# Altium footprint library Vowstar_IC_General.PcbLib: 139 footprints (part 8 of 9)
Each footprint in its own frame and in the unit in brackets; x right, y up, seen from the top. Pads: shape width x height; smd on the part's side, far side on the other; paste and mask are expansions set on the pad; w line width, h text height; cw(c..) or ccw(c..) is an arc to the next point about the centre after c.
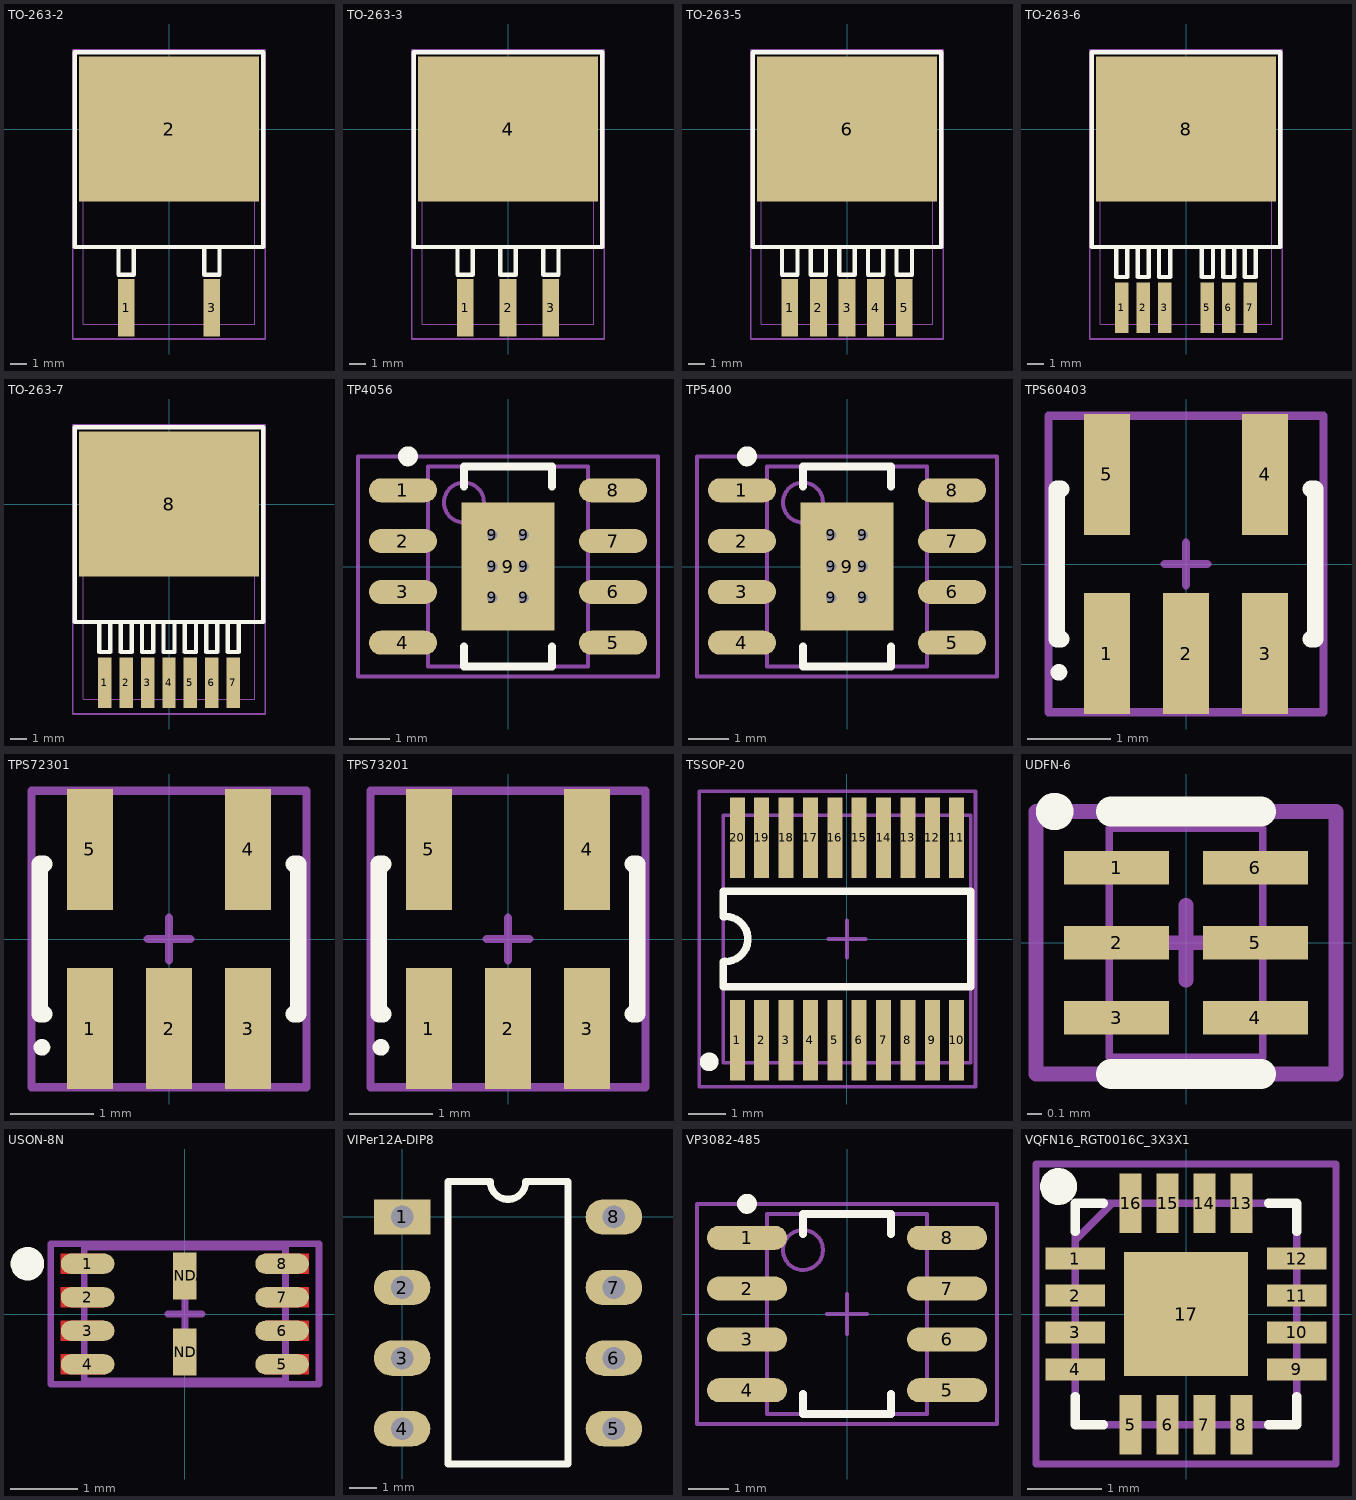
[diagram p7: the footprints below, top view; thin cyan lines are the x and y axes]

## TO-263-2 [mm] "TO-263-2,KTT2, The D2PAK or DDPAK, standardized as TO-263"
height 4.77
pads (3):
  rect 1x3.4 smd paste-0.05: 1(-2.54,-10.6) 3(2.54,-10.6)
  rect 10.7x8.6 smd paste-100: 2(0,0)
Top Overlay:
  lines w0.254: -2.997,-7.032 -2.997,-8.636 -2.083,-8.636 -2.083,-7.032 ; 2.083,-7.032 2.083,-8.636 2.997,-8.636 2.997,-7.032 ; -5.588,-6.985 5.588,-6.985 5.588,4.572 -5.588,4.572 -5.588,-6.985
Top Paste:
  rectangle: 1.524,-2.413 3.818,0
  rectangle: -1.143,-2.413 1.151,0
  rectangle: -3.81,-2.413 -1.516,0
  rectangle: -1.143,0.381 1.151,2.794
  rectangle: -5.207,-3.764 -4.257,-2.794
  rectangle: -3.855,-3.764 -2.905,-2.794
  rectangle: -2.503,-3.764 -1.553,-2.794
  rectangle: -1.151,-3.764 -0.201,-2.794
  rectangle: 0.201,-3.764 1.151,-2.794
  rectangle: 1.553,-3.764 2.503,-2.794
  rectangle: 2.905,-3.764 3.855,-2.794
  rectangle: 4.257,-3.764 5.207,-2.794
  rectangle: -5.207,-2.367 -4.257,-1.397
  rectangle: 4.257,-2.367 5.207,-1.397
  rectangle: -5.207,-0.97 -4.257,0
  rectangle: 4.257,-0.97 5.207,0
  rectangle: -5.207,0.427 -4.257,1.397
  rectangle: 4.257,0.427 5.207,1.397
  rectangle: -5.207,1.824 -4.257,2.794
  rectangle: 4.257,1.824 5.207,2.794
  rectangle: 4.257,3.221 5.207,4.191
  rectangle: 2.905,3.221 3.855,4.191
  rectangle: 1.553,3.221 2.503,4.191
  rectangle: 0.201,3.221 1.151,4.191
  rectangle: -1.151,3.221 -0.201,4.191
  rectangle: -2.503,3.221 -1.553,4.191
  rectangle: -3.855,3.221 -2.905,4.191
  rectangle: -5.207,3.221 -4.257,4.191
  rectangle: -3.81,0.381 -1.516,2.794
  rectangle: 1.524,0.381 3.818,2.794
Mechanical 13:
  lines w0.051: -5.08,-11.557 -5.08,3.683 5.08,3.683 5.08,-11.557 -5.08,-11.557
Mechanical 15:
  lines w0.1: -0.5,0 0.5,0 ; 0,-0.5 0,0.5 ; -5.715,-12.446 -5.715,4.699 5.715,4.699 5.715,-12.446 -5.715,-12.446
3D body "User Library-TO263-2.step": height 4.88, standoff -0.13, extent -5.08,-11.557 5.08,3.707

## TO-263-3 [mm] "TO-263-3,KTT3, The D2PAK or DDPAK, standardized as TO-263"
height 4.77
pads (4):
  rect 1x3.4 smd paste-0.05: 1(-2.54,-10.6) 2(0,-10.6) 3(2.54,-10.6)
  rect 10.7x8.6 smd paste-100: 4(0,0)
Top Overlay:
  lines w0.254: -2.997,-7.032 -2.997,-8.636 -2.083,-8.636 -2.083,-7.032 ; -0.457,-7.032 -0.457,-8.636 0.457,-8.636 0.457,-7.032 ; 2.083,-7.032 2.083,-8.636 2.997,-8.636 2.997,-7.032 ; -5.588,-6.985 -5.588,4.572 5.588,4.572 5.588,-6.985 -5.588,-6.985
Top Paste:
  rectangle: 1.524,-2.413 3.818,0
  rectangle: -1.143,-2.413 1.151,0
  rectangle: -3.81,-2.413 -1.516,0
  rectangle: -1.143,0.381 1.151,2.794
  rectangle: -5.207,-3.764 -4.257,-2.794
  rectangle: -3.855,-3.764 -2.905,-2.794
  rectangle: -2.503,-3.764 -1.553,-2.794
  rectangle: -1.151,-3.764 -0.201,-2.794
  rectangle: 0.201,-3.764 1.151,-2.794
  rectangle: 1.553,-3.764 2.503,-2.794
  rectangle: 2.905,-3.764 3.855,-2.794
  rectangle: 4.257,-3.764 5.207,-2.794
  rectangle: -5.207,-2.367 -4.257,-1.397
  rectangle: 4.257,-2.367 5.207,-1.397
  rectangle: -5.207,-0.97 -4.257,0
  rectangle: 4.257,-0.97 5.207,0
  rectangle: -5.207,0.427 -4.257,1.397
  rectangle: 4.257,0.427 5.207,1.397
  rectangle: -5.207,1.824 -4.257,2.794
  rectangle: 4.257,1.824 5.207,2.794
  rectangle: 4.257,3.221 5.207,4.191
  rectangle: 2.905,3.221 3.855,4.191
  rectangle: 1.553,3.221 2.503,4.191
  rectangle: 0.201,3.221 1.151,4.191
  rectangle: -1.151,3.221 -0.201,4.191
  rectangle: -2.503,3.221 -1.553,4.191
  rectangle: -3.855,3.221 -2.905,4.191
  rectangle: -5.207,3.221 -4.257,4.191
  rectangle: -3.81,0.381 -1.516,2.794
  rectangle: 1.524,0.381 3.818,2.794
Mechanical 13:
  lines w0.051: -5.08,-11.557 5.08,-11.557 5.08,3.683 -5.08,3.683 -5.08,-11.557
Mechanical 15:
  lines w0.1: -0.5,0 0.5,0 ; 0,-0.5 0,0.5 ; -5.715,-12.446 5.715,-12.446 5.715,4.699 -5.715,4.699 -5.715,-12.446
3D body "User Library-TO263-3.step": height 4.87, standoff 0, extent -5.08,-11.557 5.08,2.673

## TO-263-5 [mm] "TO-263-5,KTT5, The D2PAK or DDPAK, standardized as TO-263"
height 4.77
pads (6):
  rect 1x3.4 smd paste-0.05: 1(-3.4,-10.6) 2(-1.7,-10.6) 3(0,-10.6) 4(1.7,-10.6) 5(3.4,-10.6)
  rect 10.7x8.6 smd paste-100: 6(0,0)
Top Overlay:
  lines w0.254: -3.857,-7.032 -3.857,-8.636 -2.943,-8.636 -2.943,-7.032 ; -2.157,-7.032 -2.157,-8.636 -1.243,-8.636 -1.243,-7.032 ; -0.457,-7.032 -0.457,-8.636 0.457,-8.636 0.457,-7.032 ; 1.243,-7.032 1.243,-8.636 2.157,-8.636 2.157,-7.032 ; 2.943,-7.032 2.943,-8.636 3.857,-8.636 3.857,-7.032 ; -5.588,-6.985 5.588,-6.985 5.588,4.572 -5.588,4.572 -5.588,-6.985
Top Paste:
  rectangle: 1.524,0.381 3.818,2.794
  rectangle: -3.81,0.381 -1.516,2.794
  rectangle: -5.207,3.221 -4.257,4.191
  rectangle: -3.855,3.221 -2.905,4.191
  rectangle: -2.503,3.221 -1.553,4.191
  rectangle: -1.151,3.221 -0.201,4.191
  rectangle: 0.201,3.221 1.151,4.191
  rectangle: 1.553,3.221 2.503,4.191
  rectangle: 2.905,3.221 3.855,4.191
  rectangle: 4.257,3.221 5.207,4.191
  rectangle: 4.257,1.824 5.207,2.794
  rectangle: -5.207,1.824 -4.257,2.794
  rectangle: 4.257,0.427 5.207,1.397
  rectangle: -5.207,0.427 -4.257,1.397
  rectangle: 4.257,-0.97 5.207,0
  rectangle: -5.207,-0.97 -4.257,0
  rectangle: 4.257,-2.367 5.207,-1.397
  rectangle: -5.207,-2.367 -4.257,-1.397
  rectangle: 4.257,-3.764 5.207,-2.794
  rectangle: 2.905,-3.764 3.855,-2.794
  rectangle: 1.553,-3.764 2.503,-2.794
  rectangle: 0.201,-3.764 1.151,-2.794
  rectangle: -1.151,-3.764 -0.201,-2.794
  rectangle: -2.503,-3.764 -1.553,-2.794
  rectangle: -3.855,-3.764 -2.905,-2.794
  rectangle: -5.207,-3.764 -4.257,-2.794
  rectangle: -1.143,0.381 1.151,2.794
  rectangle: -3.81,-2.413 -1.516,0
  rectangle: -1.143,-2.413 1.151,0
  rectangle: 1.524,-2.413 3.818,0
Mechanical 13:
  lines w0.051: -5.08,-11.557 -5.08,3.683 5.08,3.683 5.08,-11.557 -5.08,-11.557
Mechanical 15:
  lines w0.1: -0.5,0 0.5,0 ; 0,-0.5 0,0.5 ; -5.715,-12.446 -5.715,4.699 5.715,4.699 5.715,-12.446 -5.715,-12.446
3D body "User Library-TO263-5.step": height 4.87, standoff 0, extent -5.08,-11.561 5.08,2.669

## TO-263-6 [mm] "TO-263-6,KTT6, The D2PAK or DDPAK, standardized as TO-263"
height 4.77
pads (7):
  rect 0.8x3 smd paste-0.05: 1(-3.81,-10.6) 2(-2.54,-10.6) 3(-1.27,-10.6) 5(1.27,-10.6) 6(2.54,-10.6) 7(3.81,-10.6)
  rect 10.7x8.6 smd paste-100: 8(0,0)
Top Overlay:
  lines w0.254: -4.14,-7.032 -4.14,-8.763 -3.48,-8.763 -3.48,-7.032 ; -2.87,-7.032 -2.87,-8.763 -2.21,-8.763 -2.21,-7.032 ; -1.6,-7.032 -1.6,-8.763 -0.94,-8.763 -0.94,-7.032 ; 0.94,-7.032 0.94,-8.763 1.6,-8.763 1.6,-7.032 ; 2.21,-7.032 2.21,-8.763 2.87,-8.763 2.87,-7.032 ; 3.48,-7.032 3.48,-8.763 4.14,-8.763 4.14,-7.032 ; -5.588,-6.985 -5.588,4.572 5.588,4.572 5.588,-6.985 -5.588,-6.985
Top Paste:
  rectangle: 1.524,0.381 3.818,2.794
  rectangle: -3.81,0.381 -1.516,2.794
  rectangle: -5.207,3.221 -4.257,4.191
  rectangle: -3.855,3.221 -2.905,4.191
  rectangle: -2.503,3.221 -1.553,4.191
  rectangle: -1.151,3.221 -0.201,4.191
  rectangle: 0.201,3.221 1.151,4.191
  rectangle: 1.553,3.221 2.503,4.191
  rectangle: 2.905,3.221 3.855,4.191
  rectangle: 4.257,3.221 5.207,4.191
  rectangle: 4.257,1.824 5.207,2.794
  rectangle: -5.207,1.824 -4.257,2.794
  rectangle: 4.257,0.427 5.207,1.397
  rectangle: -5.207,0.427 -4.257,1.397
  rectangle: 4.257,-0.97 5.207,0
  rectangle: -5.207,-0.97 -4.257,0
  rectangle: 4.257,-2.367 5.207,-1.397
  rectangle: -5.207,-2.367 -4.257,-1.397
  rectangle: 4.257,-3.764 5.207,-2.794
  rectangle: 2.905,-3.764 3.855,-2.794
  rectangle: 1.553,-3.764 2.503,-2.794
  rectangle: 0.201,-3.764 1.151,-2.794
  rectangle: -1.151,-3.764 -0.201,-2.794
  rectangle: -2.503,-3.764 -1.553,-2.794
  rectangle: -3.855,-3.764 -2.905,-2.794
  rectangle: -5.207,-3.764 -4.257,-2.794
  rectangle: -1.143,0.381 1.151,2.794
  rectangle: -3.81,-2.413 -1.516,0
  rectangle: -1.143,-2.413 1.151,0
  rectangle: 1.524,-2.413 3.818,0
Mechanical 13:
  lines w0.051: -5.08,-11.557 5.08,-11.557 5.08,3.683 -5.08,3.683 -5.08,-11.557
Mechanical 15:
  lines w0.1: -0.5,0 0.5,0 ; 0,-0.5 0,0.5 ; -5.715,-12.446 5.715,-12.446 5.715,4.699 -5.715,4.699 -5.715,-12.446
3D body "User Library-TO263-7.step": height 4.88, standoff 0.08, extent -5,-11.557 5,4.113

## TO-263-7 [mm] "TO-263-6,KTT7, The D2PAK or DDPAK, standardized as TO-263"
height 4.77
pads (8):
  rect 0.8x3 smd paste-0.05: 1(-3.81,-10.6) 2(-2.54,-10.6) 3(-1.27,-10.6) 4(0,-10.6) 5(1.27,-10.6) 6(2.54,-10.6) 7(3.81,-10.6)
  rect 10.7x8.6 smd paste-100: 8(0,0)
Top Overlay:
  lines w0.254: -4.14,-7.032 -4.14,-8.763 -3.48,-8.763 -3.48,-7.032 ; -2.87,-7.032 -2.87,-8.763 -2.21,-8.763 -2.21,-7.032 ; -1.6,-7.032 -1.6,-8.763 -0.94,-8.763 -0.94,-7.032 ; -0.33,-7.032 -0.33,-8.763 0.33,-8.763 0.33,-7.032 ; 0.94,-7.032 0.94,-8.763 1.6,-8.763 1.6,-7.032 ; 2.21,-7.032 2.21,-8.763 2.87,-8.763 2.87,-7.032 ; 3.48,-7.032 3.48,-8.763 4.14,-8.763 4.14,-7.032 ; -5.588,-6.985 5.588,-6.985 5.588,4.572 -5.588,4.572 -5.588,-6.985
Top Paste:
  rectangle: 1.524,-2.413 3.818,0
  rectangle: -1.143,-2.413 1.151,0
  rectangle: -3.81,-2.413 -1.516,0
  rectangle: -1.143,0.381 1.151,2.794
  rectangle: -5.207,-3.764 -4.257,-2.794
  rectangle: -3.855,-3.764 -2.905,-2.794
  rectangle: -2.503,-3.764 -1.553,-2.794
  rectangle: -1.151,-3.764 -0.201,-2.794
  rectangle: 0.201,-3.764 1.151,-2.794
  rectangle: 1.553,-3.764 2.503,-2.794
  rectangle: 2.905,-3.764 3.855,-2.794
  rectangle: 4.257,-3.764 5.207,-2.794
  rectangle: -5.207,-2.367 -4.257,-1.397
  rectangle: 4.257,-2.367 5.207,-1.397
  rectangle: -5.207,-0.97 -4.257,0
  rectangle: 4.257,-0.97 5.207,0
  rectangle: -5.207,0.427 -4.257,1.397
  rectangle: 4.257,0.427 5.207,1.397
  rectangle: -5.207,1.824 -4.257,2.794
  rectangle: 4.257,1.824 5.207,2.794
  rectangle: 4.257,3.221 5.207,4.191
  rectangle: 2.905,3.221 3.855,4.191
  rectangle: 1.553,3.221 2.503,4.191
  rectangle: 0.201,3.221 1.151,4.191
  rectangle: -1.151,3.221 -0.201,4.191
  rectangle: -2.503,3.221 -1.553,4.191
  rectangle: -3.855,3.221 -2.905,4.191
  rectangle: -5.207,3.221 -4.257,4.191
  rectangle: -3.81,0.381 -1.516,2.794
  rectangle: 1.524,0.381 3.818,2.794
Mechanical 13:
  lines w0.051: -5.08,-11.557 -5.08,3.683 5.08,3.683 5.08,-11.557 -5.08,-11.557
Mechanical 15:
  lines w0.1: -0.5,0 0.5,0 ; 0,-0.5 0,0.5 ; -5.715,-12.446 -5.715,4.699 5.715,4.699 5.715,-12.446 -5.715,-12.446
3D body "User Library-TO263-7.step": height 4.88, standoff 0.08, extent -5,-11.557 5,4.113

## TP4056 [mil] "TP4056 SOP8 With Pad"
height 59.06
pads (15):
  oval 66.93x23.62 smd: 1(-103.43,75) 2(-103.43,25) 3(-103.43,-25) 4(-103.43,-75) 5(103.42,-75) 6(103.42,-25) 7(103.42,25) 8(103.42,75)
  round 20 / inner round 60 / far side round 20 hole 10: 9(-15.5,-31) 9(-15.5,0) 9(-15.5,31) 9(15.5,-31) 9(15.5,0) 9(15.5,31)
  rect 91.06x126.06 smd paste-60.04: 9(0,0)
Top Overlay:
  circle w9.84: c-98.43,108.46 r4.92
  lines w7.87: -43.31,-78.74 -43.31,-98.43 43.31,-98.43 43.31,-78.74 ; -43.31,78.74 -43.31,98.43 43.31,98.43 43.31,78.74
Top Paste:
  region: -39.37,-34.94 -39.37,-57.09 -19.44,-57.09 -19.44,-40.5 -25,-34.94
  region: -11.56,-40.5 -11.56,-57.09 11.56,-57.09 11.56,-40.5 6,-34.94 -6,-34.94
  region: 19.44,-40.5 19.44,-57.09 39.37,-57.09 39.37,-34.94 25,-34.94
  region: -39.37,-3.94 -39.37,-27.06 -25,-27.06 -19.44,-21.5 -19.44,-9.5 -25,-3.94
  region: -11.56,-9.5 -11.56,-21.5 -6,-27.06 6,-27.06 11.56,-21.5 11.56,-9.5 6,-3.94 -6,-3.94
  region: 19.44,-9.5 19.44,-21.5 25,-27.06 39.37,-27.06 39.37,-3.94 25,-3.94
  region: -39.37,27.06 -39.37,3.94 -25,3.94 -19.44,9.5 -19.44,21.5 -25,27.06
  region: -11.56,21.5 -11.56,9.5 -6,3.94 6,3.94 11.56,9.5 11.56,21.5 6,27.06 -6,27.06
  region: 19.44,21.5 19.44,9.5 25,3.94 39.37,3.94 39.37,27.06 25,27.06
  region: -39.37,57.09 -39.37,34.94 -25,34.94 -19.44,40.5 -19.44,57.09
  region: -11.56,57.09 -11.56,40.5 -6,34.94 6,34.94 11.56,40.5 11.56,57.09
  region: 19.44,57.09 19.44,40.5 25,34.94 39.37,34.94 39.37,57.09
Mechanical 13:
  circle w3.94: c-43.31,62.99 r19.68
  lines w3.94: -78.74,-98.43 -78.74,98.43 78.74,98.43 78.74,-98.43 -78.74,-98.43
Mechanical 15:
  lines w3.94: -19.68,0 19.68,0 ; 0,-19.68 0,19.68 ; -147.64,-108.27 -147.64,108.27 147.64,108.27 147.64,-108.27 -147.64,-108.27
3D body "User Library-SOP-8.step": height 57, standoff 0, extent -115,-96 112.49,97

## TP5400 [mil] "TP5400 SOP8 With Pad"
height 59.06
pads (15):
  oval 66.93x23.62 smd: 1(-103.43,75) 2(-103.43,25) 3(-103.43,-25) 4(-103.43,-75) 5(103.42,-75) 6(103.42,-25) 7(103.42,25) 8(103.42,75)
  round 20 / inner round 60 / far side round 20 hole 10: 9(-15.5,-31) 9(-15.5,0) 9(-15.5,31) 9(15.5,-31) 9(15.5,0) 9(15.5,31)
  rect 91.06x126.06 smd paste-60.04: 9(0,0)
Top Overlay:
  circle w9.84: c-98.43,108.46 r4.92
  lines w7.87: -43.31,-78.74 -43.31,-98.43 43.31,-98.43 43.31,-78.74 ; -43.31,78.74 -43.31,98.43 43.31,98.43 43.31,78.74
Top Paste:
  region: 19.44,57.09 19.44,40.5 25,34.94 39.37,34.94 39.37,57.09
  region: -11.56,57.09 -11.56,40.5 -6,34.94 6,34.94 11.56,40.5 11.56,57.09
  region: -39.37,57.09 -39.37,34.94 -25,34.94 -19.44,40.5 -19.44,57.09
  region: 19.44,21.5 19.44,9.5 25,3.94 39.37,3.94 39.37,27.06 25,27.06
  region: -11.56,21.5 -11.56,9.5 -6,3.94 6,3.94 11.56,9.5 11.56,21.5 6,27.06 -6,27.06
  region: -39.37,27.06 -39.37,3.94 -25,3.94 -19.44,9.5 -19.44,21.5 -25,27.06
  region: 19.44,-9.5 19.44,-21.5 25,-27.06 39.37,-27.06 39.37,-3.94 25,-3.94
  region: -11.56,-9.5 -11.56,-21.5 -6,-27.06 6,-27.06 11.56,-21.5 11.56,-9.5 6,-3.94 -6,-3.94
  region: -39.37,-3.94 -39.37,-27.06 -25,-27.06 -19.44,-21.5 -19.44,-9.5 -25,-3.94
  region: 19.44,-40.5 19.44,-57.09 39.37,-57.09 39.37,-34.94 25,-34.94
  region: -11.56,-40.5 -11.56,-57.09 11.56,-57.09 11.56,-40.5 6,-34.94 -6,-34.94
  region: -39.37,-34.94 -39.37,-57.09 -19.44,-57.09 -19.44,-40.5 -25,-34.94
Mechanical 13:
  circle w3.94: c-43.31,62.99 r19.68
  lines w3.94: -78.74,-98.43 78.74,-98.43 78.74,98.43 -78.74,98.43 -78.74,-98.43
Mechanical 15:
  lines w3.94: -19.68,0 19.68,0 ; 0,-19.68 0,19.68 ; -147.64,-108.27 147.64,-108.27 147.64,108.27 -147.64,108.27 -147.64,-108.27
3D body "User Library-SOP-8.step": height 57, standoff 0, extent -115,-96 112.49,97

## TPS60403 [mm] "TPS60403"
height 1.25
pads (5):
  rect 0.55x1.45 smd: 1(-0.95,-1.075) 2(0,-1.075) 3(0.95,-1.075) 4(0.95,1.075) 5(-0.95,1.075)
Top Overlay:
  circle w0.1: c-1.525,-1.3 r0.05
  lines w0.2: -1.5,-0.9 -1.55,-0.9 -1.55,0.9 -1.5,0.9 ; 1.5,-0.9 1.55,-0.9 1.55,0.9 1.5,0.9
Mechanical 15:
  lines w0.1: -0.254,0 0.254,0 ; 0,-0.254 0,0.254 ; -1.651,-1.778 1.651,-1.778 1.651,1.778 -1.651,1.778 -1.651,-1.778
3D body "User Library-SOT23-5.step": height 1.45, standoff 0, extent -1.448,-1.397 1.452,1.403

## TPS72301 [mm] "TPS72301"
height 1.25
pads (5):
  rect 0.55x1.45 smd: 1(-0.95,-1.075) 2(0,-1.075) 3(0.95,-1.075) 4(0.95,1.075) 5(-0.95,1.075)
Top Overlay:
  circle w0.1: c-1.525,-1.3 r0.05
  lines w0.2: -1.5,-0.9 -1.55,-0.9 -1.55,0.9 -1.5,0.9 ; 1.5,-0.9 1.55,-0.9 1.55,0.9 1.5,0.9
Mechanical 15:
  lines w0.1: -0.254,0 0.254,0 ; 0,-0.254 0,0.254 ; -1.651,-1.778 1.651,-1.778 1.651,1.778 -1.651,1.778 -1.651,-1.778
3D body "User Library-SOT23-5.step": height 1.45, standoff 0, extent -1.448,-1.397 1.452,1.403

## TPS73201 [mm] "TPS73201"
height 1.25
pads (5):
  rect 0.55x1.45 smd: 1(-0.95,-1.075) 2(0,-1.075) 3(0.95,-1.075) 4(0.95,1.075) 5(-0.95,1.075)
Top Overlay:
  circle w0.1: c-1.525,-1.3 r0.05
  lines w0.2: -1.5,-0.9 -1.55,-0.9 -1.55,0.9 -1.5,0.9 ; 1.5,-0.9 1.55,-0.9 1.55,0.9 1.5,0.9
Mechanical 15:
  lines w0.1: -0.254,0 0.254,0 ; 0,-0.254 0,0.254 ; -1.651,-1.778 -1.651,1.778 1.651,1.778 1.651,-1.778 -1.651,-1.778
3D body "User Library-SOT23-5.step": height 1.45, standoff 0, extent -1.448,-1.397 1.452,1.403

## TSSOP-20 [mm] "TSSOP, Plastic; 20 Leads; Body Width 5.3 mm; Pitch 0.65 mm"
height 2
pads (20):
  rect 0.4x2.15 smd: 1(-2.925,-2.7) 2(-2.275,-2.7) 3(-1.625,-2.7) 4(-0.975,-2.7) 5(-0.325,-2.7) 6(0.325,-2.7) 7(0.975,-2.7) 8(1.625,-2.7) 9(2.275,-2.7) 10(2.925,-2.7) 11(2.925,2.7) 12(2.275,2.7) 13(1.625,2.7) 14(0.975,2.7) 15(0.325,2.7) 16(-0.325,2.7) 17(-0.975,2.7) 18(-1.625,2.7) 19(-2.275,2.7) 20(-2.925,2.7)
Top Overlay:
  circle w0.25: c-3.675,-3.275 r0.125
  lines w0.2: -3.302,-0.61 -3.302,-1.27 3.302,-1.27 3.302,1.27 -3.302,1.27 -3.302,0.6 ; -3.242,-0.6 ccw(c-3.242,0) -3.242,0.6
Mechanical 13:
  lines w0.1: -3.302,-3.302 3.302,-3.302 3.302,3.302 -3.302,3.302 -3.302,-3.302
Mechanical 15:
  lines w0.1: -0.5,0 0.5,0 ; 0,-0.5 0,0.5 ; -3.937,-3.937 3.429,-3.937 3.429,3.937 -3.937,3.937 -3.937,-3.937
3D body "User Library-TSSOP-20-1.step": height 1.2, standoff 0, extent -3.302,-3.275 3.298,3.275

## UDFN-6 [mil] "1.5mm x 1.0mm x 0.75mm,  6-pin μDFN package."
height 29.53
pads (6):
  rect 28x9 smd mask+4: 1(-18.5,20) 2(-18.5,0) 3(-18.5,-20) 4(18.5,-20) 5(18.5,0) 6(18.5,20)
Top Overlay:
  circle w6: c-35,35 r2
  lines w7.87: -20,-35 20,-35 ; -20,35 20,35
Mechanical 13:
  lines w2: -20.5,-30.5 20.5,-30.5 20.5,30.5 -20.5,30.5 -20.5,-30.5
Mechanical 15:
  lines w3.94: -10,0 10,0 ; 0,-10 0,10 ; -40,-35 -40,35 40,35 40,-35 -40,-35
3D body: height 29.57, standoff 0, extent -13.9,16.07 -6.06,23.93
3D body: height 29.53, standoff 0, extent -20,-30 20,30

## USON-8N [mm]
height 0.6
pads (10):
  oval 0.8x0.3 smd paste+0 mask+0.102: 1(-1.45,0.75) 2(-1.45,0.25) 3(-1.45,-0.25) 4(-1.45,-0.75) 5(1.45,-0.75) 6(1.45,-0.25) 7(1.45,0.25) 8(1.45,0.75)
  rect 0.35x0.7 smd paste+0 mask+0.102: GNDA(0,0.57) GNDB(0,-0.57)
Top Layer:
  region: -1.2,0.6 -1.2,0.9 -1.85,0.9 -1.85,0.6
  region: -1.2,0.1 -1.2,0.4 -1.85,0.4 -1.85,0.1
  region: -1.2,-0.4 -1.2,-0.1 -1.85,-0.1 -1.85,-0.4
  region: -1.2,-0.9 -1.2,-0.6 -1.85,-0.6 -1.85,-0.9
  region: 1.2,0.9 1.2,0.6 1.85,0.6 1.85,0.9
  region: 1.2,0.4 1.2,0.1 1.85,0.1 1.85,0.4
  region: 1.2,-0.1 1.2,-0.4 1.85,-0.4 1.85,-0.1
  region: 1.2,-0.6 1.2,-0.9 1.85,-0.9 1.85,-0.6
Top Overlay:
  circle w0.25: c-2.35,0.75 r0.125
Top Paste:
  region: -1.2,0.6 -1.2,0.9 -1.85,0.9 -1.85,0.6
  region: -1.2,0.1 -1.2,0.4 -1.85,0.4 -1.85,0.1
  region: -1.2,-0.4 -1.2,-0.1 -1.85,-0.1 -1.85,-0.4
  region: -1.2,-0.9 -1.2,-0.6 -1.85,-0.6 -1.85,-0.9
  region: 1.2,0.9 1.2,0.6 1.85,0.6 1.85,0.9
  region: 1.2,0.4 1.2,0.1 1.85,0.1 1.85,0.4
  region: 1.2,-0.1 1.2,-0.4 1.85,-0.4 1.85,-0.1
  region: 1.2,-0.6 1.2,-0.9 1.85,-0.9 1.85,-0.6
Top Solder:
  region: -1.95,1 -1.95,0.5 -1.2,0.5 -1.2,1
  region: -1.95,0.5 -1.95,0 -1.2,0 -1.2,0.5
  region: -1.95,0 -1.95,-0.5 -1.2,-0.5 -1.2,0
  region: -1.95,-0.5 -1.95,-1 -1.2,-1 -1.2,-0.5
  region: 1.95,0.5 1.95,1 1.2,1 1.2,0.5
  region: 1.95,0 1.95,0.5 1.2,0.5 1.2,0
  region: 1.95,-0.5 1.95,0 1.2,0 1.2,-0.5
  region: 1.95,-1 1.95,-0.5 1.2,-0.5 1.2,-1
Mechanical 13:
  lines w0.1: -1.5,-1 -1.5,1 1.5,1 1.5,-1 -1.5,-1
Mechanical 15:
  lines w0.1: -0.254,0 0.254,0 ; 0,-0.254 0,0.254 ; -2,-1.05 2,-1.05 2,1.05 -2,1.05 -2,-1.05
3D body "User Library-USON-8.step": height 0.6, standoff 0, extent -1.51,-1 1.51,1

## VIPer12A-DIP8 [mil] "VIPer12A"
pads (8):
  rect 80x50 hole 32: 1(0,0)
  oval 80x50 hole 32: 2(0,-100) 3(0,-200) 4(0,-300) 5(300,-300) 6(300,-200) 7(300,-100) 8(300,0)
Top Overlay:
  lines w10: 65,-350 65,50 125,50 ccw(c150,50) 175,50 235,50 235,-350 65,-350
3D body "User Library-DIP-8-300-metric.step": height 177.17, standoff -137.8, extent -3,-362.6 302.54,62.6

## VP3082-485 [mm] "485"
pads (8):
  oval 2x0.6 smd: 1(-2.5,1.905) 2(-2.5,0.635) 3(-2.5,-0.635) 4(-2.5,-1.905) 5(2.5,-1.905) 6(2.5,-0.635) 7(2.5,0.635) 8(2.5,1.905)
Top Overlay:
  circle w0.25: c-2.5,2.755 r0.125
  lines w0.2: -1.1,-2 -1.1,-2.5 1.1,-2.5 1.1,-2 ; -1.1,2 -1.1,2.5 1.1,2.5 1.1,2
Mechanical 13:
  circle w0.1: c-1.1,1.6 r0.5
  lines w0.1: -2,-2.5 -2,2.5 2,2.5 2,-2.5 -2,-2.5
Mechanical 15:
  lines w0.1: -0.5,0 0.5,0 ; 0,-0.5 0,0.5 ; -3.75,-2.75 -3.75,2.75 3.75,2.75 3.75,-2.75 -3.75,-2.75
3D body "User Library-SOP-8.step": height 1.45, standoff 0, extent -2.921,-2.451 2.857,2.451

## VQFN16_RGT0016C_3X3X1 [mm] "VQFN16 RGT0016C,3x3x1mm,PLASTIC QUAD FLATPACK - NO LEAD"
height 1
pads (17):
  rect 0.8x0.3 smd: 1(-1.5,0.75) 2(-1.5,0.25) 3(-1.5,-0.25) 4(-1.5,-0.75) 9(1.5,-0.75) 10(1.5,-0.25) 11(1.5,0.25) 12(1.5,0.75)
  rect 0.3x0.8 smd: 5(-0.75,-1.5) 6(-0.25,-1.5) 7(0.25,-1.5) 8(0.75,-1.5) 13(0.75,1.5) 14(0.25,1.5) 15(-0.25,1.5) 16(-0.75,1.5)
  rect 1.68x1.68 smd paste-0.13: 17(0,0)
Top Overlay:
  circle w0.25: c-1.727,1.727 r0.125
  lines w0.127: -1.499,-1.118 -1.499,-1.499 -1.118,-1.499 ; -1.499,1.118 -1.499,1.499 -1.118,1.499 ; 1.118,-1.499 1.499,-1.499 1.499,-1.118 ; 1.118,1.499 1.499,1.499 1.499,1.118
Mechanical 13:
  lines w0.1: -1.5,1 -1,1.5 ; -1.5,-1.5 1.5,-1.5 1.5,1.5 -1.5,1.5 -1.5,-1.5
Mechanical 15:
  lines w0.1: -0.254,0 0.254,0 ; 0,-0.254 0,0.254 ; -2.032,-2.032 2.032,-2.032 2.032,2.032 -2.032,2.032 -2.032,-2.032
3D body "TMP468_VQFN16_RGT0016C.STEP": height 1, standoff 0, extent -1.5,-1.5 1.5,1.5